# Altium footprint library 我的元件库02.PcbLib: 300 footprints (part 11 of 19)
Each footprint in its own frame and in the unit in brackets; x right, y up, seen from the top. Pads: shape width x height; smd on the part's side, far side on the other; paste and mask are expansions set on the pad; w line width, h text height; cw(c..) or ccw(c..) is an arc to the next point about the centre after c.
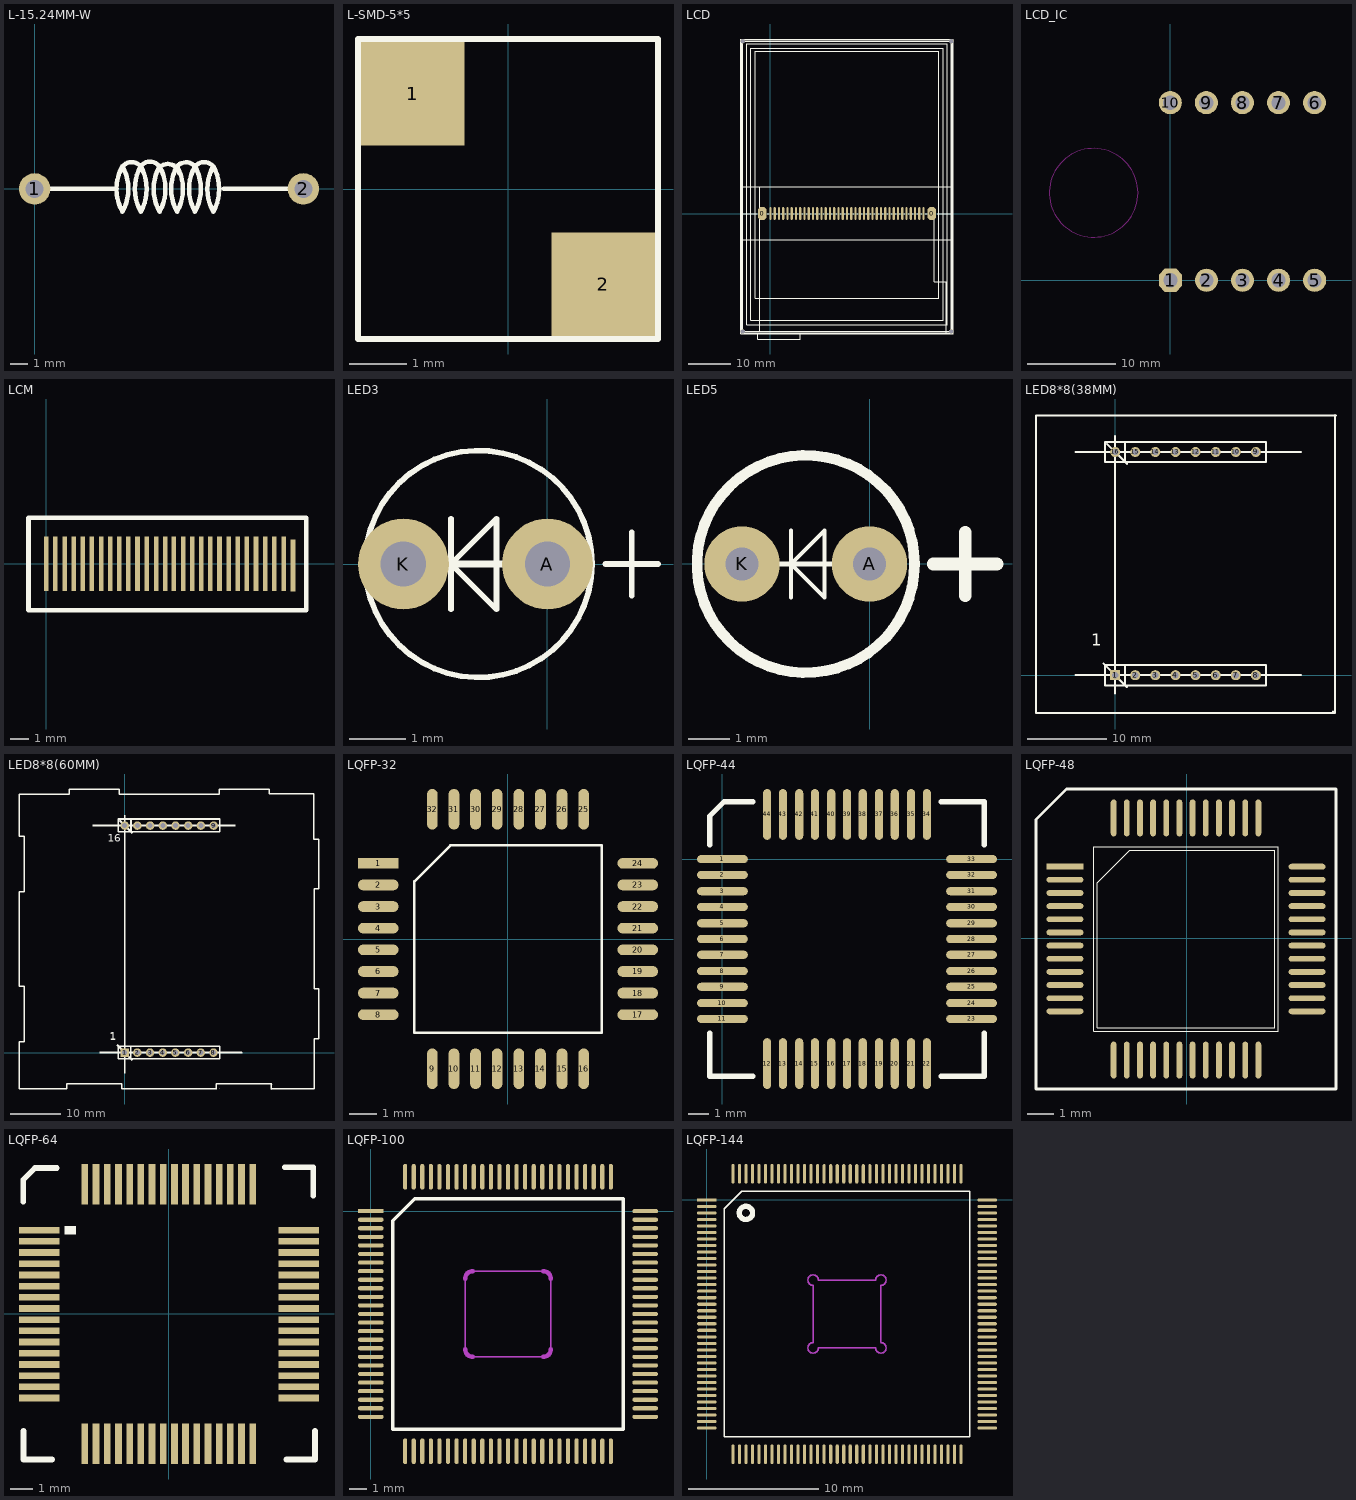
[diagram p10: the footprints below, top view; thin cyan lines are the x and y axes]

## L-15.24MM-W [mil]
height 196.85
pads (2):
  round 70 hole 40: 1(0,0) 2(600,0.11)
Top Overlay:
  lines w10: 0,0.19 183,0 ; 190.9,37.97 cw(c216.57,33.69) 242.12,38.6 ; 231.9,38.97 cw(c257.57,34.69) 283.12,39.6 ; 271.9,33.97 cw(c297.57,29.69) 323.12,34.6 ; 312.12,37.6 cw(c337.78,33.33) 363.33,38.24 ; 352.9,37.97 cw(c378.57,33.69) 404.12,38.6 ; 422,0 600,0.25 ; 195.86,50.46 ccw(c286.74,-0.15) 196,-51 ccw(c105.12,-0.4) 195.86,50.46 ; 236.86,50.46 cw(c146.12,-0.4) 237,-51 cw(c327.74,-0.15) 236.86,50.46 ; 278.86,50.46 cw(c188.12,-0.4) 279,-51 cw(c369.74,-0.15) 278.86,50.46 ; 317.86,50.46 cw(c227.12,-0.4) 318,-51 cw(c408.74,-0.15) 317.86,50.46 ; 357.86,50.46 cw(c267.12,-0.4) 358,-51 cw(c448.74,-0.15) 357.86,50.46 ; 398.86,50.46 ccw(c489.74,-0.15) 399,-51 ccw(c308.12,-0.4) 398.86,50.46
3D body: height 275.59, standoff -80.63, extent -12.06,-120.22 608.06,116

## L-SMD-5*5 [mm]
pads (2):
  rect 1.8x1.8 smd: 1(-1.651,1.651) 2(1.651,-1.651)
Top Overlay:
  lines w0.1: -2.6,-2.6 2.6,-2.6 2.6,2.6 -2.6,2.6 -2.6,-2.6

## LCD [mm]
pads (43):
  round 1 hole 1: 0(-6.52,-27.715) 0(-6.52,40.535) 0(42.52,-27.711) 0(42.52,40.538)
  oct 2x3 smd: 0(-1.901,0) 0(37.905,-0.003)
  oval 0.5x3 smd: 1(0,0) 2(1,0) 3(2,0) 4(3,0) 5(4,0) 6(5,0) 7(6,0) 8(7,0) 9(8,0) 10(9,0) 11(10,0) 12(11,0) 13(12,0) 14(13,0) 15(14,0) 16(15,0) 17(16,0) 18(17,0) 19(18,0) 20(19,0) 21(20,0) 22(21,0) 23(22,0) 24(23,0) 25(24,0) 26(25,0) 27(26,0) 28(27,0) 29(28,0) 30(29,0) 31(30,0) 32(31,0) 33(32,0) 34(33,0) 35(34,0) 36(35,0) 37(36,0)
Top Overlay:
  circle w0.254: c37.48,-0.5 r0.25
  circle w0.254: c-1.52,-0.5 r0.25
  lines w0.127: -6.52,0 -3.095,0 ; -0.809,0 -0.301,0 ; 0.389,-0.003 0.643,-0.003 ; 1.405,-0.003 1.633,-0.003 ; 2.395,-0.003 2.649,-0.003 ; 3.411,-0.003 3.64,-0.003 ; 4.351,-0.003 4.605,-0.003 ; 5.393,-0.003 5.621,-0.003 ; 6.358,-0.003 6.586,-0.003 ; 7.374,-0.003 7.628,-0.003 ; 8.364,-0.003 8.618,-0.003 ; 9.38,-0.003 9.634,-0.003 ; 10.371,-0.003 10.6,-0.003 ; 11.387,-0.003 11.641,-0.003 ; 12.378,-0.003 12.581,-0.003 ; 13.368,-0.003 13.597,-0.003 ; 14.333,-0.003 14.587,-0.003 ; 15.375,-0.003 15.603,-0.003 ; 16.365,-0.003 16.594,-0.003 ; 17.331,-0.003 17.559,-0.003 ; 18.321,-0.003 18.55,-0.003 ; 19.337,-0.003 19.591,-0.003 ; 20.328,-0.003 20.582,-0.003 ; 21.318,-0.003 21.598,-0.003 ; 22.36,-0.003 22.614,-0.003 ; 23.35,-0.003 23.604,-0.003 ; 24.341,-0.003 24.57,-0.003 ; 25.357,-0.003 25.56,-0.003 ; 26.322,-0.003 26.576,-0.003 ; 27.364,-0.003 27.592,-0.003 ; 28.354,-0.003 28.583,-0.003 ; 29.345,-0.003 29.599,-0.003 ; 30.335,-0.003 30.564,-0.003 ; 31.351,-0.003 31.605,-0.003 ; 32.367,-0.003 32.621,-0.003 ; 33.383,-0.003 33.612,-0.003 ; 34.374,-0.003 34.628,-0.003 ; 35.365,-0.003 35.593,-0.003 ; 36.381,-0.003 36.863,-0.003 ; 39.247,0 42.756,0
  lines w0.254: -6.8,40.335 -6.8,-27.995 42.8,-27.995 42.8,40.815 -6.8,40.815 ; -6.52,-6.175 42.654,-6.175 ; -6.52,6.285 42.756,6.285 ; -3,-28.215 -3,-29.5 7,-29.5 7,-28.215 ; -2.52,-27.816 -2.52,6.285 ; 38.48,0 38.48,-16 41.38,-16 41.38,-27.939 ; 43.02,41.035 -7.02,41.035 -7.02,-28.215 43.02,-28.215 43.02,41.038 ; -6.52,-27.715 42.52,-27.715 42.52,40.535 -6.52,40.535 -6.52,-27.715 ; -5.6,-26.165 -5.6,39.915 41.6,39.915 41.6,-26.165 -5.6,-26.165 ; -4.6,-25.065 40.6,-25.065 40.6,38.915 -4.6,38.915 -4.6,-25.065 ; -3.6,-19.865 39.6,-19.865 39.6,38.215 -3.6,38.215 -3.6,-19.865

## LCD_IC [mm]
pads (10):
  oct 2.6x2.6 hole 1.6: 1(0,0)
  round 2.6 hole 1.6: 2(4.064,0) 3(8.128,0) 4(12.192,0) 5(16.256,0) 6(16.242,20.014) 7(12.178,20.014) 8(8.114,20.014) 9(4.05,20.014) 10(-0.014,20.014)
Bottom Overlay:
  circle w0.1: c-8.65,9.854 r6.5
  lines w0.254: -2.586,-1.941 -2.586,22.259 -2.026,22.819 18.224,22.819 18.664,22.379 18.664,-1.881 18.294,-2.251 -2.276,-2.251 ; -2.564,-1.977 -2.31,-2.231
Keep-Out Layer:
  circle w0.1: c-8.65,9.854 r5

## LCM [mm]
pads (28):
  rect 0.25x3 smd: 1(0,0) 2(0.5,0) 3(1,0) 4(1.5,0) 5(2,0) 6(2.5,0) 7(3,0) 8(3.5,0) 9(4,0) 10(4.5,0) 11(5,0) 12(5.5,0) 13(6.032,0) 14(6.532,0) 15(7,0) 16(7.5,0) 17(8,0) 18(8.5,0) 19(9,0) 20(9.5,0) 21(10,0) 22(10.5,0) 23(11,0) 24(11.5,0) 25(12,0) 26(12.5,0) 27(13.032,0)
  rect 0.25x2.85 smd: 28(13.532,-0.083)
Top Overlay:
  lines w0.254: -0.976,-2.548 -0.976,2.532 14.264,2.532 14.264,-2.548 -0.976,-2.548

## LED3 [mm]
pads (2):
  round 1.6 hole 0.8: A(0,0) K(-2.54,0)
Top Overlay:
  circle w0.1: c-1.216,0 r2
  lines w0.1: -1.7,-0.8 -1.7,0 ; -1.7,0.8 -1.7,0 ; 1.024,0 1.948,0 ; 1.486,-0.562 1.486,0.562 ; -1.7,0 -0.9,0.8 -0.9,-0.8 -1.7,0
  lines w0.127: -1.7,0 -0.686,0
3D body: height 5.2, standoff -2, extent -3.241,-1.998 0.279,1.998

## LED5 [mm]
pads (2):
  round 1.8 hole 0.8: A(0,0) K(-3.048,0)
Top Overlay:
  circle w0.254: c-1.524,0 r2.6
  lines w0.1: -1.878,-0.8 -1.878,0 ; -1.878,0.8 -1.878,0 ; -1.878,0 -1.078,0.8 -1.078,-0.8 -1.878,0
  lines w0.127: -2.134,0 -0.889,0
  lines w0.305: 1.524,0 3.048,0 ; 2.286,-0.762 2.286,0.762
3D body: height 8.6, standoff -2, extent -4.351,-2.905 0.999,2.794

## LED8*8(38MM) [mil]
pads (16):
  rect 50x50 hole 32: 1(0,0)
  round 50 hole 32: 2(100,0) 3(200,0) 4(300,0) 5(400,0) 6(500,0) 7(600,0) 8(700,0) 9(699.94,1110.29) 10(599.94,1110.29) 11(499.94,1110.29) 12(399.94,1110.29) 13(299.94,1110.29) 14(199.94,1110.29) 15(99.94,1110.29) 16(-0.06,1110.29)
Top Overlay:
  lines w10: -196.85,0 0,0 925.2,0 ; -196.85,1110.24 925.2,1110.24 ; -59.05,59.05 59.05,-59.05 ; -39.37,1149.61 59.05,1051.18 ; 0,-90.55 0,1110.24 0,1188.98 ; 49.95,1060.29 49.95,1160.29 ; 50,-50 50,50 ; 1082.68,-181.1 1086.61,-185.04 ; 1094.49,1295.28 1094.49,-188.98 -393.7,-188.98 -393.7,1291.34 1098.42,1291.34 ; -50.05,1060.29 -50.05,1160.29 749.95,1160.29 749.95,1060.29 -50.05,1060.29 ; -50,-50 -50,50 750,50 750,-50 -50,-50
  text "1" at -118.11,145.67 h60

## LED8*8(60MM) [mm]
pads (16):
  rect 1.7x1.7 hole 1: 1(0,0)
  round 1.7 hole 1: 2(2.54,0) 3(5.08,0) 4(7.62,0) 5(10.16,0) 6(12.7,0) 7(15.24,0) 8(17.78,0) 9(17.804,45.426) 10(15.264,45.426) 11(12.724,45.426) 12(10.184,45.426) 13(7.644,45.426) 14(5.104,45.426) 15(2.564,45.426) 16(0.024,45.426)
Top Overlay:
  lines w0.254: -20.129,12.734 -20.129,13.27 -21.115,13.27 -21.115,32.22 -20.143,32.22 -20.109,32.254 -20.109,32.74 -20.109,42.746 ; -20.115,42.752 -20.115,43.262 -21.129,43.262 -21.115,43.276 -21.115,51.734 -20.113,51.734 -11.117,51.734 -11.097,51.754 -11.097,52.724 -1.111,52.724 -1.111,51.754 -1.091,51.734 18.883,51.734 18.883,52.746 28.867,52.746 28.889,52.724 28.889,51.754 37.865,51.754 37.885,51.734 37.885,42.738 38.885,42.738 38.875,42.728 38.875,32.752 37.905,32.752 37.905,12.738 38.875,12.738 38.875,2.752 37.905,2.752 37.905,-7.23 37.881,-7.254 29.411,-7.254 29.385,-7.28 29.385,-6.28 29.399,-6.266 18.371,-6.266 18.371,-7.228 18.397,-7.254 -0.593,-7.254 -0.605,-7.266 -0.605,-6.28 -0.619,-6.266 -11.567,-6.266 -11.581,-6.28 -11.581,-7.266 -11.593,-7.254 -21.115,-7.254 -21.115,-6.262 -21.115,2.214 -20.129,2.214 -20.113,2.23 -20.113,2.732 -20.113,12.718 ; -20.113,42.742 -20.109,42.738 ; -6.381,45.487 22.119,45.487 ; -6.356,45.437 22.144,45.437 ; -5.025,0.05 -0.025,0.05 23.475,0.05 ; -5,0 0,0 23.5,0 ; -1.525,1.55 1.475,-1.45 ; -1.5,1.5 1.5,-1.5 ; -1,46.475 1.5,43.975 ; -0.975,46.425 1.525,43.925 ; 0,45.475 0,47.475 ; 0.019,-4.123 0.019,45.387 ; 0.025,45.425 0.025,47.425 ; 0.044,-4.173 0.044,45.337 ; 1.245,-1.22 1.245,1.32 ; 1.269,44.206 1.269,46.746 ; 1.27,-1.27 1.27,1.27 ; 1.294,44.156 1.294,46.696 ; 18.893,-7.266 18.905,-7.254 ; -1.295,-1.22 19.025,-1.22 19.025,1.32 -1.295,1.32 -1.295,-1.22 ; -1.271,44.206 19.049,44.206 19.049,46.746 -1.271,46.746 -1.271,44.206 ; -1.27,-1.27 19.05,-1.27 19.05,1.27 -1.27,1.27 -1.27,-1.27 ; -1.246,44.156 19.074,44.156 19.074,46.696 -1.246,46.696 -1.246,44.156
  text "1" at -3.025,2.55 h1.52
  text "1" at -3,2.5 h1.52
  text "16" at -3.387,42.232 h1.52

## Logo_USB [mm]
3D body: height 0.1, standoff 0, extent -5.529,-2.286 5.935,2.213

## LQFP-32 [mm]
pads (32):
  rect 1.5x0.4 smd: 1(-4.8,2.8)
  oval 1.5x0.4 smd: 2(-4.8,2) 3(-4.8,1.2) 4(-4.8,0.4) 5(-4.8,-0.4) 6(-4.8,-1.2) 7(-4.8,-2) 8(-4.8,-2.8) 17(4.8,-2.8) 18(4.8,-2) 19(4.8,-1.2) 20(4.8,-0.4) 21(4.8,0.4) 22(4.8,1.2) 23(4.8,2) 24(4.8,2.8)
  oval 0.4x1.5 smd: 9(-2.8,-4.8) 10(-2,-4.8) 11(-1.2,-4.8) 12(-0.4,-4.8) 13(0.4,-4.8) 14(1.2,-4.8) 15(2,-4.8) 16(2.8,-4.8) 25(2.8,4.8) 26(2,4.8) 27(1.2,4.8) 28(0.4,4.8) 29(-0.4,4.8) 30(-1.2,4.8) 31(-2,4.8) 32(-2.8,4.8)
Top Overlay:
  lines w0.1: -3.465,-3.465 3.465,-3.465 3.465,3.465 -2.13,3.465 -3.465,2.13 -3.465,-3.465
3D body: height 1.6, standoff -0.05, extent -4.495,-4.494 4.505,4.506

## LQFP-44 [mil]
pads (44):
  oval 100x16 smd: 1(0,0) 2(0,-31) 3(0,-63) 4(0,-94) 5(0,-126) 6(0,-157) 7(0,-188) 8(0,-220) 9(0,-251) 10(0,-283) 11(0,-314) 23(490,-314) 24(490,-283) 25(490,-251) 26(490,-220) 27(490,-188) 28(490,-157) 29(490,-126) 30(490,-94) 31(490,-63) 32(490,-31) 33(490,0)
  oval 16x100 smd: 12(88,-402) 13(119,-402) 14(151,-402) 15(182,-402) 16(214,-402) 17(245,-402) 18(276,-402) 19(308,-402) 20(339,-402) 21(371,-402) 22(402,-402) 34(402,88) 35(371,88) 36(339,88) 37(308,88) 38(276,88) 39(245,88) 40(214,88) 41(182,88) 42(151,88) 43(119,88) 44(88,88)
Top Overlay:
  lines w10: -25,-342 -25,-427 60,-427 ; -25,28 -25,85 3,113 60,113 ; 430,-427 515,-427 515,-342 ; 430,113 515,113 515,28
3D body: height 43.31, standoff -0.39, extent 9.56,-393.22 482,79.22

## LQFP-48 [mm]
height 1
pads (48):
  rect 1.4x0.22 smd: 1(-4.625,2.725)
  oval 1.4x0.22 smd: 2(-4.625,2.225) 3(-4.625,1.725) 4(-4.625,1.225) 5(-4.625,0.725) 6(-4.625,0.225) 7(-4.625,-0.275) 8(-4.625,-0.775) 9(-4.625,-1.275) 10(-4.625,-1.775) 11(-4.625,-2.275) 12(-4.625,-2.775) 25(4.575,-2.775) 26(4.575,-2.275) 27(4.575,-1.775) 28(4.575,-1.275) 29(4.575,-0.775) 30(4.575,-0.275) 31(4.575,0.225) 32(4.575,0.725) 33(4.575,1.225) 34(4.575,1.725) 35(4.575,2.225) 36(4.575,2.725)
  oval 0.22x1.4 smd: 13(-2.775,-4.625) 14(-2.275,-4.625) 15(-1.775,-4.625) 16(-1.275,-4.625) 17(-0.775,-4.625) 18(-0.275,-4.625) 19(0.225,-4.625) 20(0.725,-4.625) 21(1.225,-4.625) 22(1.725,-4.625) 23(2.225,-4.625) 24(2.725,-4.625) 37(2.725,4.575) 38(2.225,4.575) 39(1.725,4.575) 40(1.225,4.575) 41(0.725,4.575) 42(0.225,4.575) 43(-0.275,4.575) 44(-0.775,4.575) 45(-1.275,4.575) 46(-1.775,4.575) 47(-2.275,4.575) 48(-2.775,4.575)
Top Overlay:
  lines w0.025: -3.525,-3.525 3.475,-3.525 3.475,3.475 -3.525,3.475 -3.525,3.4 -3.525,-0.025 -3.525,-3.525 ; -3.39,-3.39 -3.39,2.105 -2.155,3.34 3.34,3.34 3.34,-3.39 -3.39,-3.39
  lines w0.102: -5.725,-5.725 5.675,-5.725 5.675,5.675 -4.561,5.675 -5.725,4.511 -5.725,-5.725
3D body: height 1.45, standoff 0, extent -4.525,-4.53 4.475,4.47

## LQFP-64 [mm]
pads (64):
  rect 1.8x0.3 smd: 1(-5.8,3.746) 2(-5.8,3.246) 3(-5.8,2.746) 4(-5.8,2.246) 5(-5.8,1.746) 6(-5.8,1.246) 7(-5.8,0.746) 8(-5.8,0.246) 9(-5.8,-0.254) 10(-5.8,-0.754) 11(-5.8,-1.254) 12(-5.8,-1.754) 13(-5.8,-2.254) 14(-5.8,-2.754) 15(-5.8,-3.254) 16(-5.8,-3.754) 33(5.8,-3.754) 34(5.8,-3.254) 35(5.8,-2.754) 36(5.8,-2.254) 37(5.8,-1.754) 38(5.8,-1.254) 39(5.8,-0.754) 40(5.8,-0.254) 41(5.8,0.246) 42(5.8,0.746) 43(5.8,1.246) 44(5.8,1.746) 45(5.8,2.246) 46(5.8,2.746) 47(5.8,3.246) 48(5.8,3.746)
  rect 0.3x1.8 smd: 17(-3.759,-5.8) 18(-3.259,-5.8) 19(-2.759,-5.8) 20(-2.259,-5.8) 21(-1.759,-5.8) 22(-1.259,-5.8) 23(-0.759,-5.8) 24(-0.259,-5.8) 25(0.241,-5.8) 26(0.741,-5.8) 27(1.241,-5.8) 28(1.741,-5.8) 29(2.241,-5.8) 30(2.741,-5.8) 31(3.241,-5.8) 32(3.741,-5.8) 49(3.741,5.8) 50(3.241,5.8) 51(2.741,5.8) 52(2.241,5.8) 53(1.741,5.8) 54(1.241,5.8) 55(0.741,5.8) 56(0.241,5.8) 57(-0.259,5.8) 58(-0.759,5.8) 59(-1.259,5.8) 60(-1.759,5.8) 61(-2.259,5.8) 62(-2.759,5.8) 63(-3.259,5.8) 64(-3.759,5.8)
Top Overlay:
  rectangle: -4.658,3.55 -4.151,3.931
  lines w0.254: -6.517,5.017 -6.517,5.992 -5.984,6.525 -5.009,6.525 ; -6.502,-5.225 -6.502,-6.5 -5.227,-6.5 ; 5.166,6.553 6.441,6.553 6.441,5.278 ; 5.248,-6.5 6.523,-6.5 6.523,-5.225
3D body: height 1.58, standoff 0, extent -6.535,-6.53 6.515,6.521

## LQFP-100 [mm]
pads (100):
  rect 1.5x0.24 smd: 1(0,0)
  oval 1.5x0.24 smd: 2(0,-0.5) 3(0,-1) 4(0,-1.5) 5(0,-2) 6(0,-2.5) 7(0,-3) 8(0,-3.5) 9(0,-4) 10(0,-4.5) 11(0,-5) 12(0,-5.5) 13(0,-6) 14(0,-6.5) 15(0,-7) 16(0,-7.5) 17(0,-8) 18(0,-8.5) 19(0,-9) 20(0,-9.5) 21(0,-10) 22(0,-10.5) 23(0,-11) 24(0,-11.5) 25(0,-12) 51(16,-12) 52(16,-11.5) 53(16,-11) 54(16,-10.5) 55(16,-10) 56(16,-9.5) 57(16,-9) 58(16,-8.5) 59(16,-8) 60(16,-7.5) 61(16,-7) 62(16,-6.5) 63(16,-6) 64(16,-5.5) 65(16,-5) 66(16,-4.5) 67(16,-4) 68(16,-3.5) 69(16,-3) 70(16,-2.5) 71(16,-2) 72(16,-1.5) 73(16,-1) 74(16,-0.5) 75(16,0)
  oval 0.24x1.5 smd: 26(2,-14) 27(2.5,-14) 28(3,-14) 29(3.5,-14) 30(4,-14) 31(4.5,-14) 32(5,-14) 33(5.5,-14) 34(6,-14) 35(6.5,-14) 36(7,-14) 37(7.5,-14) 38(8,-14) 39(8.5,-14) 40(9,-14) 41(9.5,-14) 42(10,-14) 43(10.5,-14) 44(11,-14) 45(11.5,-14) 46(12,-14) 47(12.5,-14) 48(13,-14) 49(13.5,-14) 50(14,-14) 76(14,2) 77(13.5,2) 78(13,2) 79(12.5,2) 80(12,2) 81(11.5,2) 82(11,2) 83(10.5,2) 84(10,2) 85(9.5,2) 86(9,2) 87(8.5,2) 88(8,2) 89(7.5,2) 90(7,2) 91(6.5,2) 92(6,2) 93(5.5,2) 94(5,2) 95(4.5,2) 96(4,2) 97(3.5,2) 98(3,2) 99(2.5,2) 100(2,2)
Top Overlay:
  lines w0.2: 1.285,-12.715 14.715,-12.715 14.715,0.715 2.57,0.715 1.285,-0.57 1.285,-12.715
Keep-Out Layer:
  lines w0.1: 5.5,-8.05 5.5,-3.95 ; 5.95,-8.5 10.05,-8.5 ; 5.95,-3.5 10.05,-3.5 ; 10.5,-8.05 10.5,-3.95
  lines w0.254: 5.5,-8.05 ccw(c5.95,-8.05) 5.95,-8.5 ; 5.5,-3.95 cw(c5.95,-3.95) 5.95,-3.5 ; 10.05,-8.5 ccw(c10.05,-8.05) 10.5,-8.05 ; 10.05,-3.5 cw(c10.05,-3.95) 10.5,-3.95
Mechanical 1:
  lines w0.1: 5.5,-8.05 5.5,-3.95 ; 5.95,-8.5 10.05,-8.5 ; 5.95,-3.5 10.05,-3.5 ; 10.5,-8.05 10.5,-3.95
  lines w0.254: 5.5,-8.05 ccw(c5.95,-8.05) 5.95,-8.5 ; 5.5,-3.95 cw(c5.95,-3.95) 5.95,-3.5 ; 10.05,-8.5 ccw(c10.05,-8.05) 10.5,-8.05 ; 10.05,-3.5 cw(c10.05,-3.95) 10.5,-3.95
3D body: height 1.61, standoff -0.01, extent 0,-13.993 16,2.007

## LQFP-144 [mm]
pads (144):
  rect 1.5x0.24 smd: 1(0,0)
  oval 1.5x0.24 smd: 2(0,-0.5) 3(0,-1) 4(0,-1.5) 5(0,-2) 6(0,-2.5) 7(0,-3) 8(0,-3.5) 9(0,-4) 10(0,-4.5) 11(0,-5) 12(0,-5.5) 13(0,-6) 14(0,-6.5) 15(0,-7) 16(0,-7.5) 17(0,-8) 18(0,-8.5) 19(0,-9) 20(0,-9.5) 21(0,-10) 22(0,-10.5) 23(0,-11) 24(0,-11.5) 25(0,-12) 26(0,-12.5) 27(0,-13) 28(0,-13.5) 29(0,-14) 30(0,-14.5) 31(0,-15) 32(0,-15.5) 33(0,-16) 34(0,-16.5) 35(0,-17) 36(0,-17.5) 73(21.5,-17.5) 74(21.5,-17) 75(21.5,-16.5) 76(21.5,-16) 77(21.5,-15.5) 78(21.5,-15) 79(21.5,-14.5) 80(21.5,-14) 81(21.5,-13.5) 82(21.5,-13) 83(21.5,-12.5) 84(21.5,-12) 85(21.5,-11.5) 86(21.5,-11) 87(21.5,-10.5) 88(21.5,-10) 89(21.5,-9.5) 90(21.5,-9) 91(21.5,-8.5) 92(21.5,-8) 93(21.5,-7.5) 94(21.5,-7) 95(21.5,-6.5) 96(21.5,-6) 97(21.5,-5.5) 98(21.5,-5) 99(21.5,-4.5) 100(21.5,-4) 101(21.5,-3.5) 102(21.5,-3) 103(21.5,-2.5) 104(21.5,-2) 105(21.5,-1.5) 106(21.5,-1) 107(21.5,-0.5) 108(21.5,0)
  oval 0.24x1.5 smd: 37(2,-19.5) 38(2.5,-19.5) 39(3,-19.5) 40(3.5,-19.5) 41(4,-19.5) 42(4.5,-19.5) 43(5,-19.5) 44(5.5,-19.5) 45(6,-19.5) 46(6.5,-19.5) 47(7,-19.5) 48(7.5,-19.5) 49(8,-19.5) 50(8.5,-19.5) 51(9,-19.5) 52(9.5,-19.5) 53(10,-19.5) 54(10.5,-19.5) 55(11,-19.5) 56(11.5,-19.5) 57(12,-19.5) 58(12.5,-19.5) 59(13,-19.5) 60(13.5,-19.5) 61(14,-19.5) 62(14.5,-19.5) 63(15,-19.5) 64(15.5,-19.5) 65(16,-19.5) 66(16.5,-19.5) 67(17,-19.5) 68(17.5,-19.5) 69(18,-19.5) 70(18.5,-19.5) 71(19,-19.5) 72(19.5,-19.5) 109(19.5,2) 110(19,2) 111(18.5,2) 112(18,2) 113(17.5,2) 114(17,2) 115(16.5,2) 116(16,2) 117(15.5,2) 118(15,2) 119(14.5,2) 120(14,2) 121(13.5,2) 122(13,2) 123(12.5,2) 124(12,2) 125(11.5,2) 126(11,2) 127(10.5,2) 128(10,2) 129(9.5,2) 130(9,2) 131(8.5,2) 132(8,2) 133(7.5,2) 134(7,2) 135(6.5,2) 136(6,2) 137(5.5,2) 138(5,2) 139(4.5,2) 140(4,2) 141(3.5,2) 142(3,2) 143(2.5,2) 144(2,2)
Top Overlay:
  circle w0.406: c3,-1 r0.508
  lines w0.1: 1.335,-18.165 20.165,-18.165 20.165,0.665 2.67,0.665 1.335,-0.67 1.335,-18.165
Keep-Out Layer:
  lines w0.1: 12.95,-11.35 ccw(c13.35,-11.35) 13.35,-10.95 ; 12.954,-11.35 8.55,-11.35 cw(c8.15,-11.35) 8.15,-10.95 8.15,-6.55 cw(c8.15,-6.15) 8.55,-6.15 12.95,-6.15 cw(c13.35,-6.15) 13.35,-6.55 13.35,-10.922
Mechanical 1:
  lines w0.1: 12.95,-11.35 ccw(c13.35,-11.35) 13.35,-10.95 ; 12.954,-11.35 8.55,-11.35 cw(c8.15,-11.35) 8.15,-10.95 8.15,-6.55 cw(c8.15,-6.15) 8.55,-6.15 12.95,-6.15 cw(c13.35,-6.15) 13.35,-6.55 13.35,-10.922